# Altium schematic symbol library 13-Logic 数字 IC.SchLib: 324 symbols (part 1 of 30) (continued)
## 5AGXMB1G4F40C4N (continued)
part Q pins: D1 GND (power), D2 GND (power), D5 GND (power), D36 GND (power), D37 GND (power), D38 GND (power), D39 GND (power), E1 GND (power), E2 GND (power), E3 GND (power), E4 GND (power), E8 GND (power), E11 GND (power), E14 GND (power), E17 GND (power), E20 GND (power), E23 GND (power), E26 GND (power), E29 GND (power), E32 GND (power), E35 GND (power), E38 GND (power), E39 GND (power), F1 GND (power), F2 GND (power), F5 GND (power), F36 GND (power), F37 GND (power), F38 GND (power), F39 GND (power), G1 GND (power), G2 GND (power), G3 GND (power), G4 GND (power), G35 GND (power), G38 GND (power), G39 GND (power), H1 GND (power), H2 GND (power), H5 GND (power), H8 GND (power), H11 GND (power), H14 GND (power), H17 GND (power), H20 GND (power), H23 GND (power), H26 GND (power), H29 GND (power), H32 GND (power), H36 GND (power), H37 GND (power), H38 GND (power), H39 GND (power), J1 GND (power), J2 GND (power), J3 GND (power), J4 GND (power), J35 GND (power), J38 GND (power), J39 GND (power), K1 GND (power), K2 GND (power), K5 GND (power), K36 GND (power), K37 GND (power), K38 GND (power), K39 GND (power), L1 GND (power), L2 GND (power), L3 GND (power), L4 GND (power), L8 GND (power), L11 GND (power), L14 GND (power), L17 GND (power), L20 GND (power), L23 GND (power), L26 GND (power), L29 GND (power), L32 GND (power), L35 GND (power), L38 GND (power), L39 GND (power), M1 GND (power), M2 GND (power), M5 GND (power), M36 GND (power), M37 GND (power), M38 GND (power), M39 GND (power), N1 GND (power), N2 GND (power), N3 GND (power), N4 GND (power), N5 GND (power), N6 GND (power), N8 GND (power), N35 GND (power), N38 GND (power), N39 GND (power), P1 GND (power), P2 GND (power), P6 GND (power), P7 GND (power), P11 GND (power), P14 GND (power), P17 GND (power), P20 GND (power), P23 GND (power), P26 GND (power), P29 GND (power), P32 GND (power), P35 GND (power), P36 GND (power), P37 GND (power), P38 GND (power), P39 GND (power), R3 GND (power), R4 GND (power), R8 GND (power), R34 GND (power), R38 GND (power), R39 GND (power), T1 GND (power), T2 GND (power), T5 GND (power), T7 GND (power), T8 GND (power), T9 GND (power), T10 GND (power), T32 GND (power), T36 GND (power), T37 GND (power), T38 GND (power), T39 GND (power), U3 GND (power), U4 GND (power), U6 GND (power), U8 GND (power), U11 GND (power), U13 GND (power), U15 GND (power), U17 GND (power), U20 GND (power), U23 GND (power), U25 GND (power), U27 GND (power), U30 GND (power), U31 GND (power), U32 GND (power), U33 GND (power), U35 GND (power), U38 GND (power), U39 GND (power), V1 GND (power), V2 GND (power), V7 GND (power), V8 GND (power), V9 GND (power), V10 GND (power), V12 GND (power), V14 GND (power), V16 GND (power), V18 GND (power), V21 GND (power), V24 GND (power), V26 GND (power), V28 GND (power), V30 GND (power), V32 GND (power), V34 GND (power), V36 GND (power), V37 GND (power), V38 GND (power), V39 GND (power), W3 GND (power), W4 GND (power), W8 GND (power), W11 GND (power), W13 GND (power), W15 GND (power), W17 GND (power), W19 GND (power), W21 GND (power), W23 GND (power), W25 GND (power), W27 GND (power), W29 GND (power), W31 GND (power), W32 GND (power), W33 GND (power), W38 GND (power), W39 GND (power), Y1 GND (power), Y2 GND (power), Y5 GND (power), Y7 GND (power), Y10 GND (power), Y12 GND (power), Y14 GND (power), Y16 GND (power), Y18 GND (power), Y20 GND (power), Y22 GND (power), Y24 GND (power), Y26 GND (power), Y28 GND (power), Y31 GND (power), Y32 GND (power), Y36 GND (power), Y37 GND (power), Y38 GND (power), Y39 GND (power)
part R pins: A38 DNU (io), AE20 DNU (io), AF3 DNU (io), AF4 DNU (io), AH3 DNU (io), AH4 DNU (io), AH31 DNU (io), AK3 DNU (io), AK4 DNU (io), AV3 DNU (io), AW3 DNU (io), B3 DNU (io), B4 DNU (io), B38 DNU (io), C5 DNU (io), C36 DNU (io), C37 DNU (io), D3 DNU (io), D4 DNU (io), E36 DNU (io), E37 DNU (io), F3 DNU (io), F4 DNU (io), G36 DNU (io), G37 DNU (io), H3 DNU (io), H4 DNU (io), J36 DNU (io), J37 DNU (io), K3 DNU (io), K4 DNU (io), L36 DNU (io), L37 DNU (io), M3 DNU (io), M4 DNU (io), N36 DNU (io), N37 DNU (io), P21 DNU (io), R36 DNU (io), R37 DNU (io), U36 DNU (io), U37 DNU (io), W36 DNU (io), W37 DNU (io)

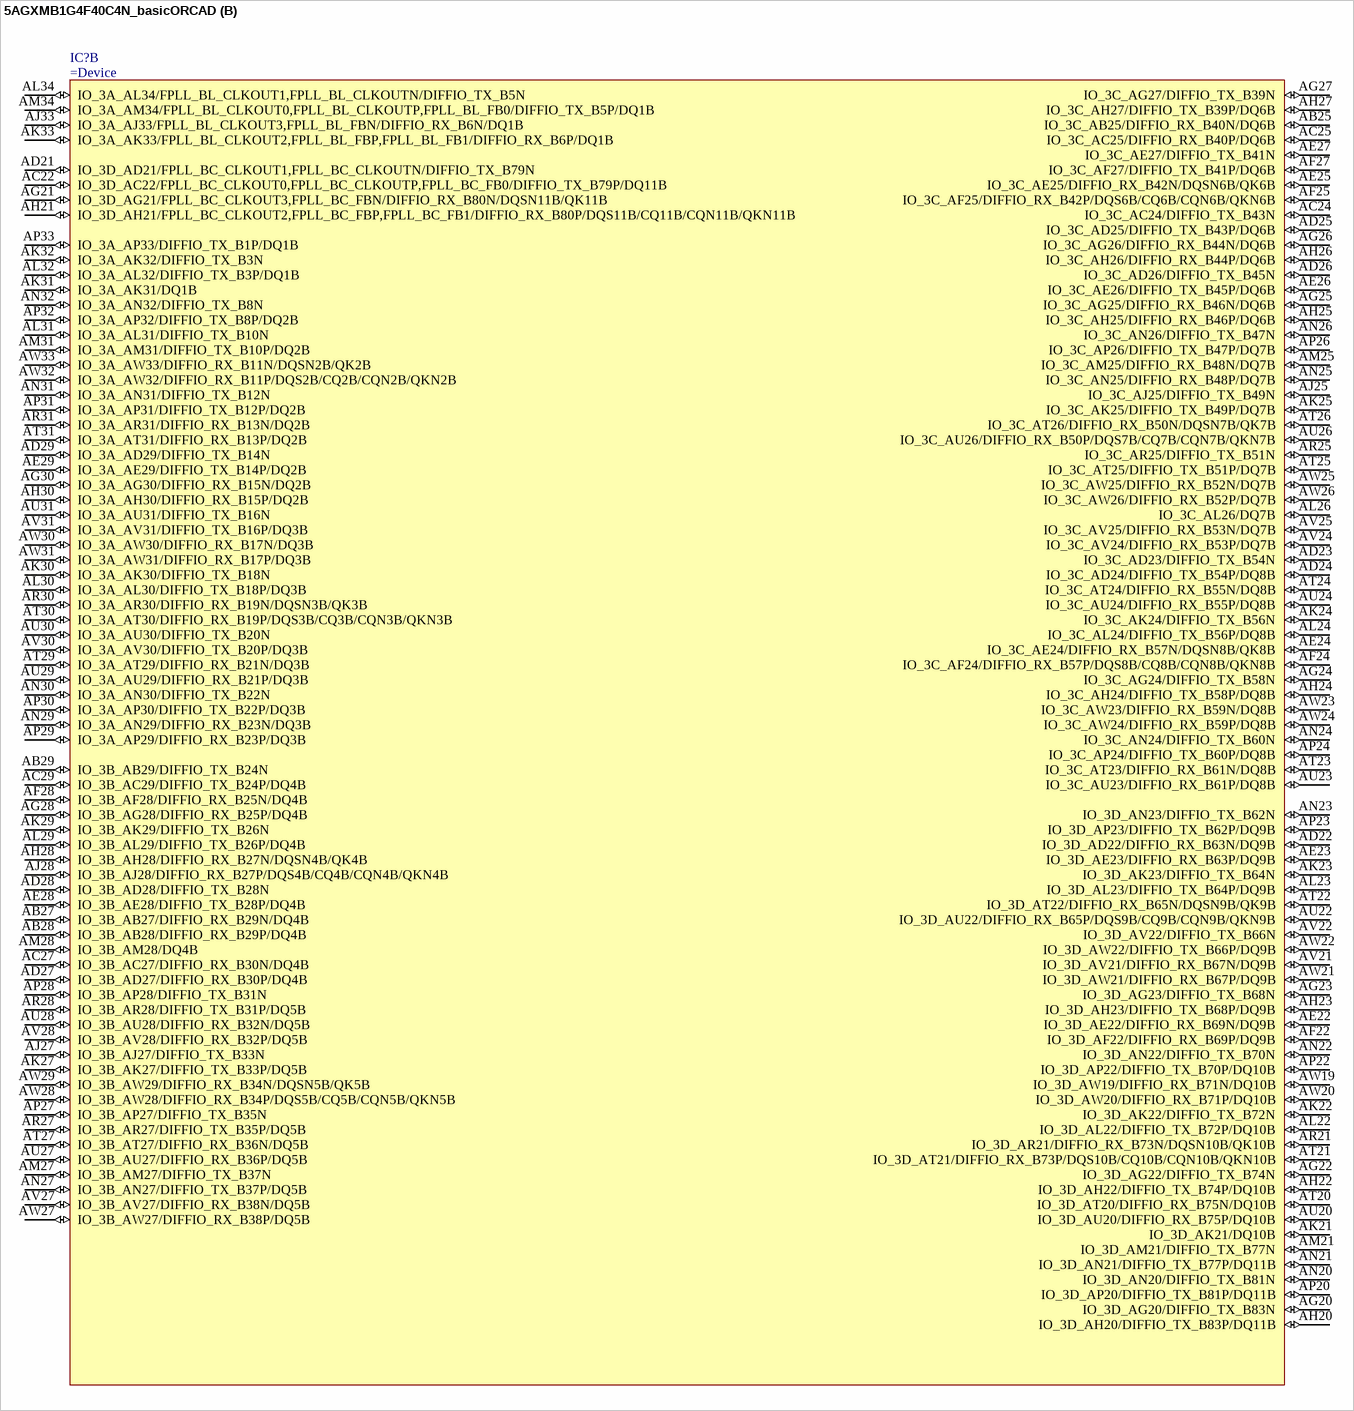
[diagram p6: symbol 5AGXMB1G4F40C4N_basicORCAD]

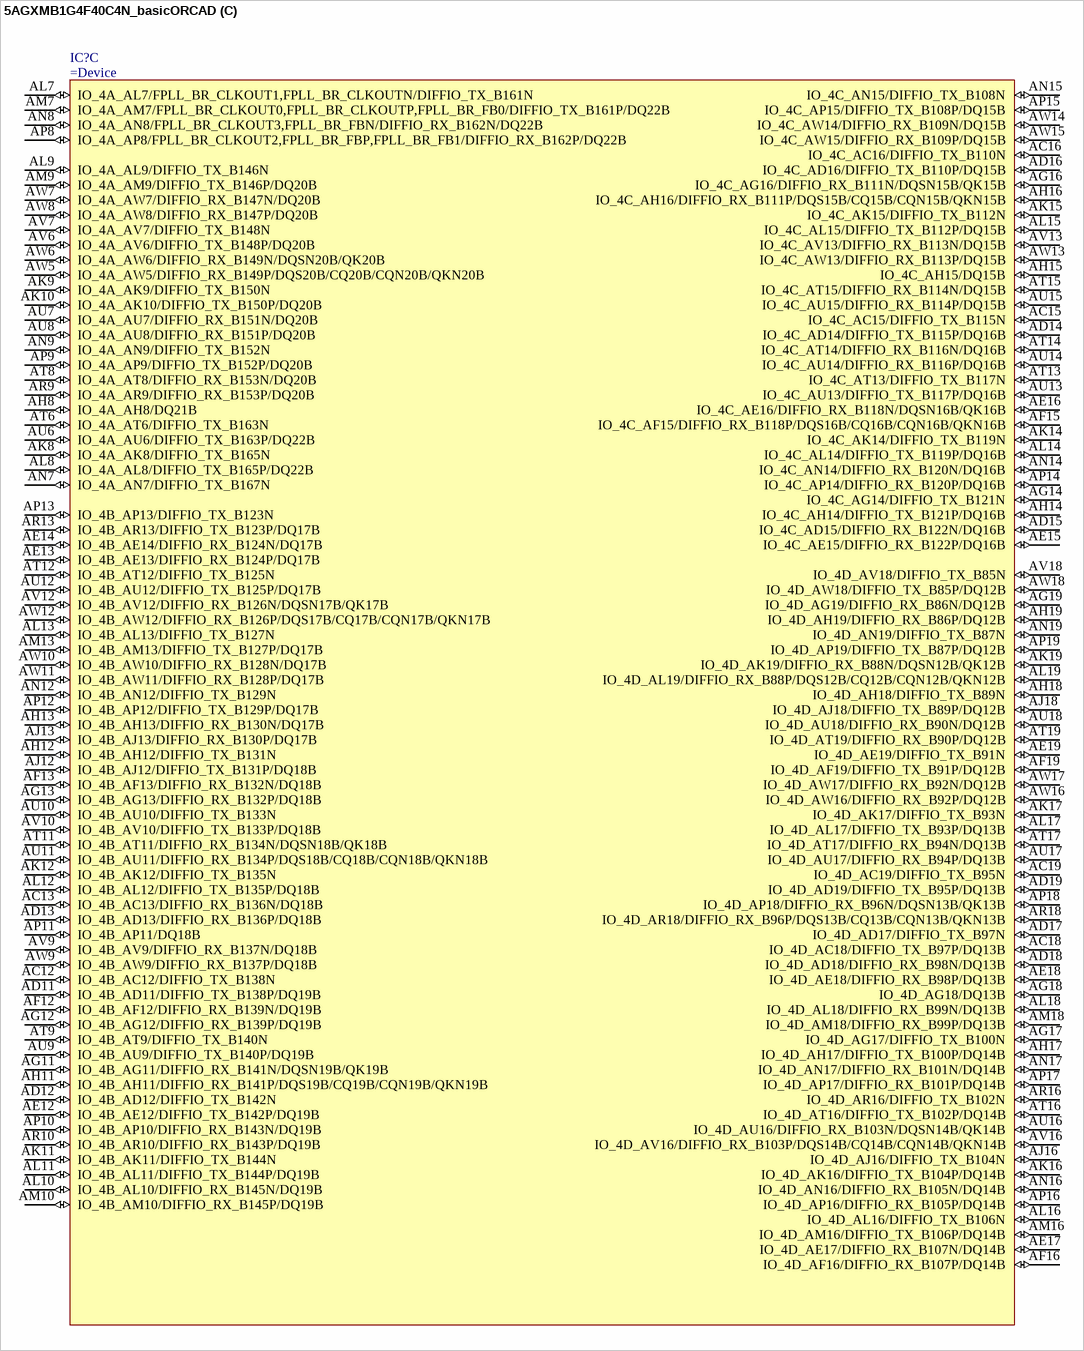
[diagram p7: symbol 5AGXMB1G4F40C4N_basicORCAD]

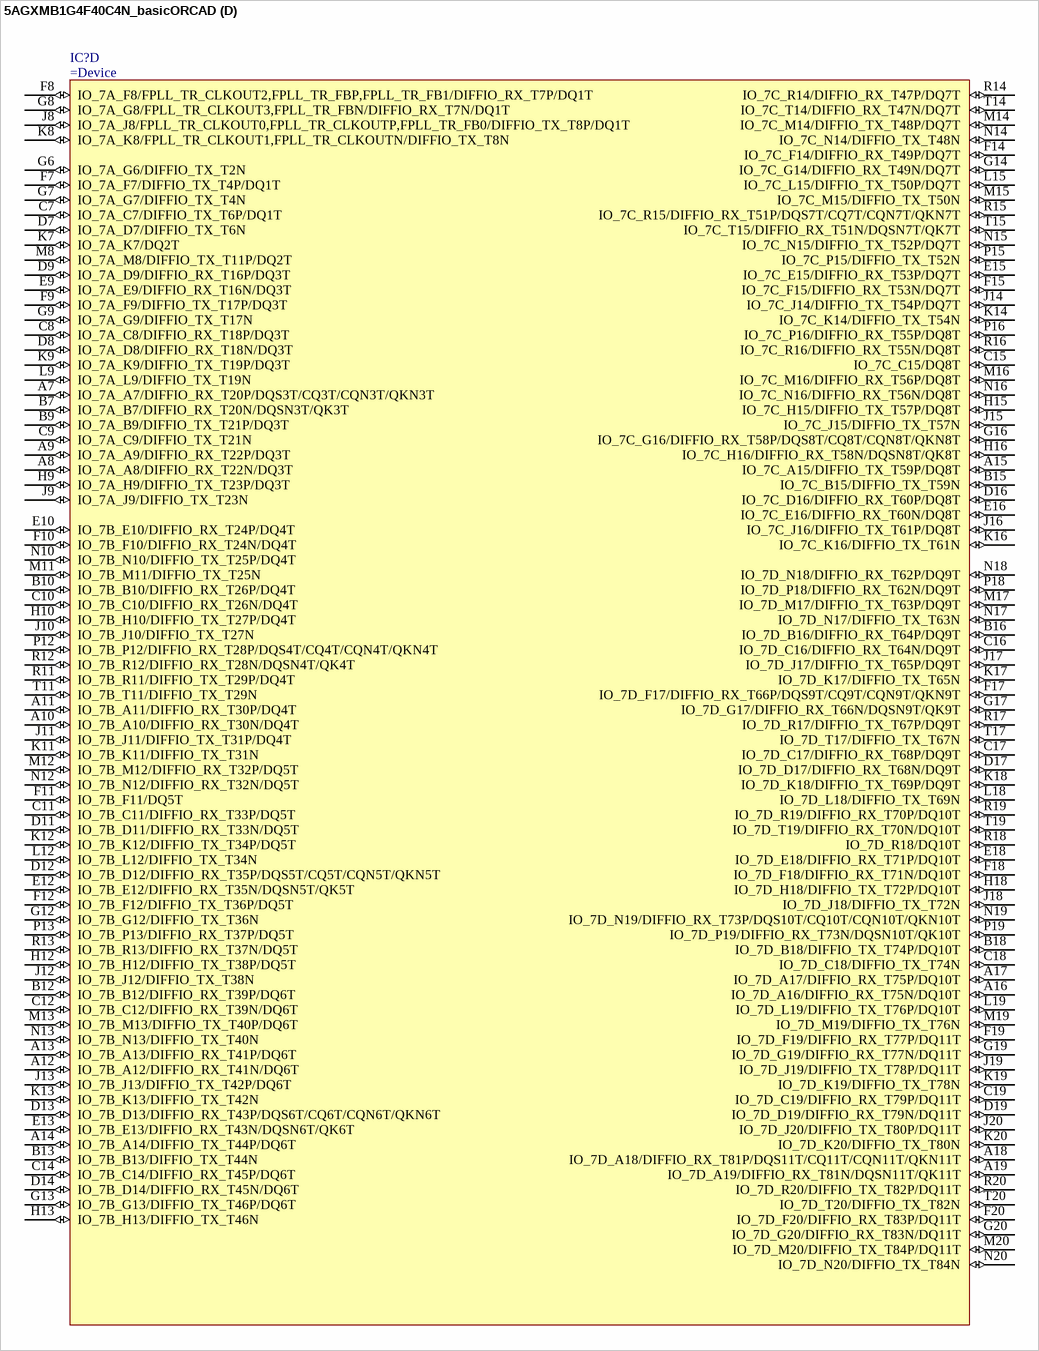
[diagram p8: symbol 5AGXMB1G4F40C4N_basicORCAD]

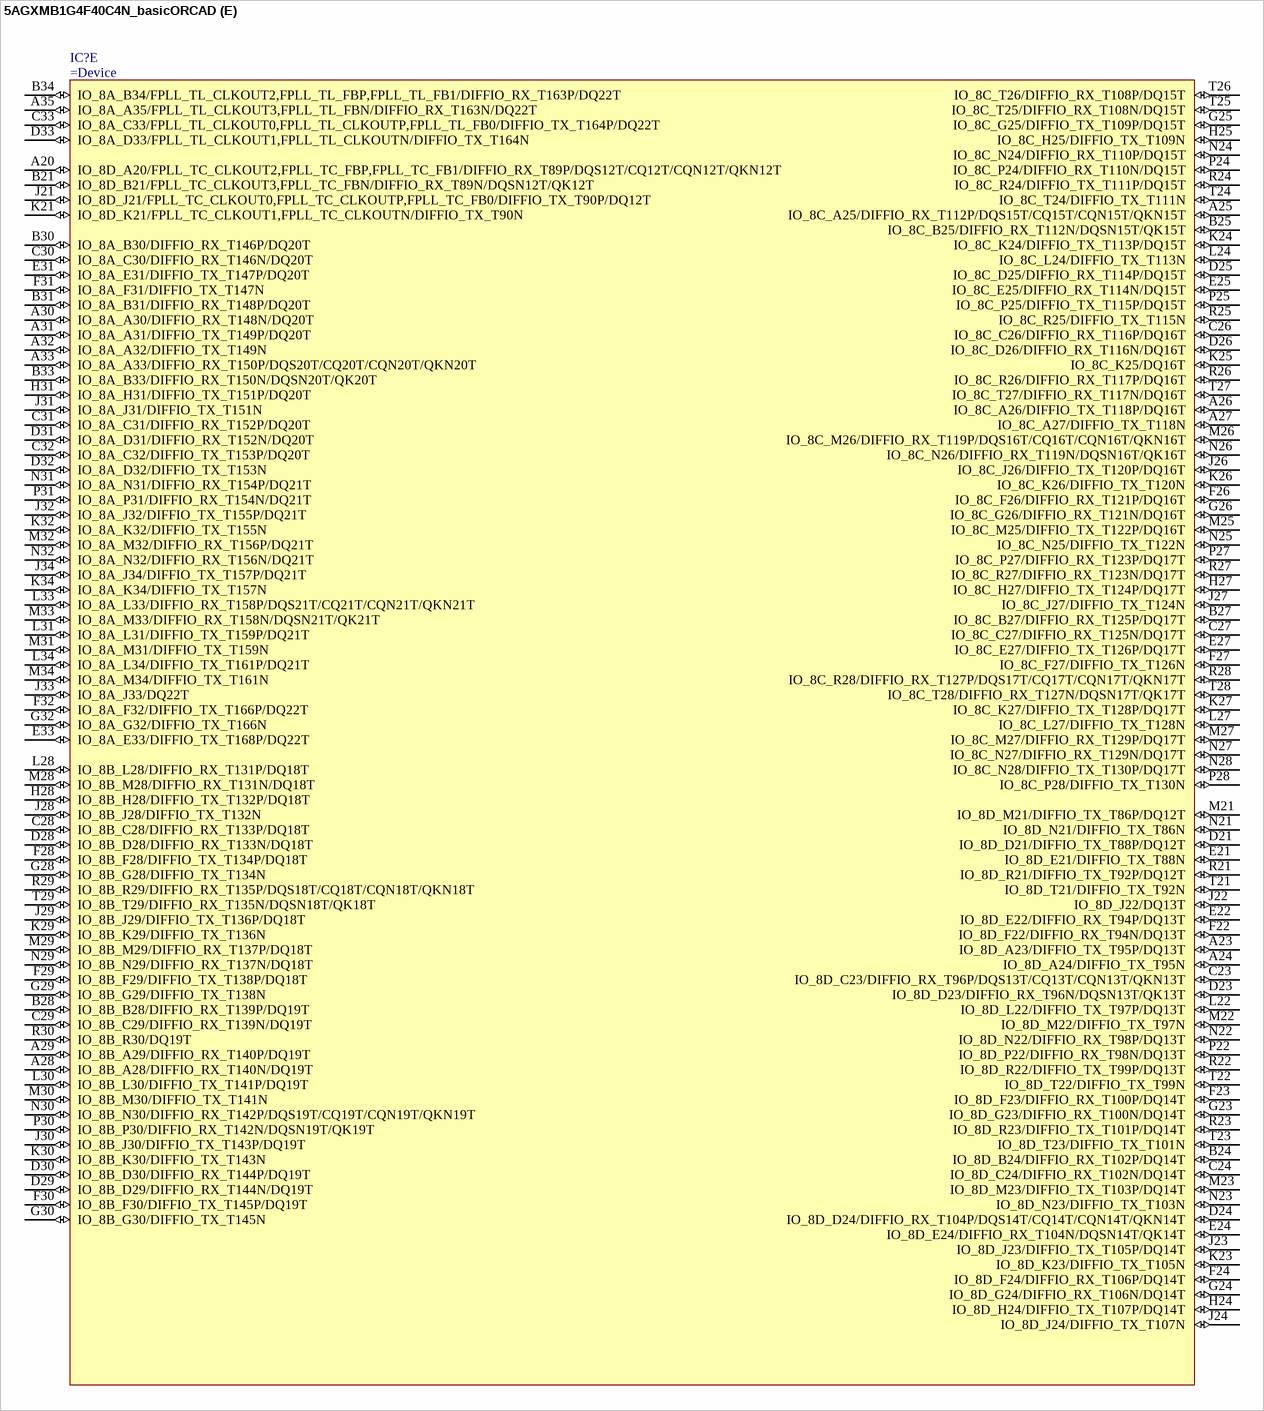
[diagram p9: symbol 5AGXMB1G4F40C4N_basicORCAD]

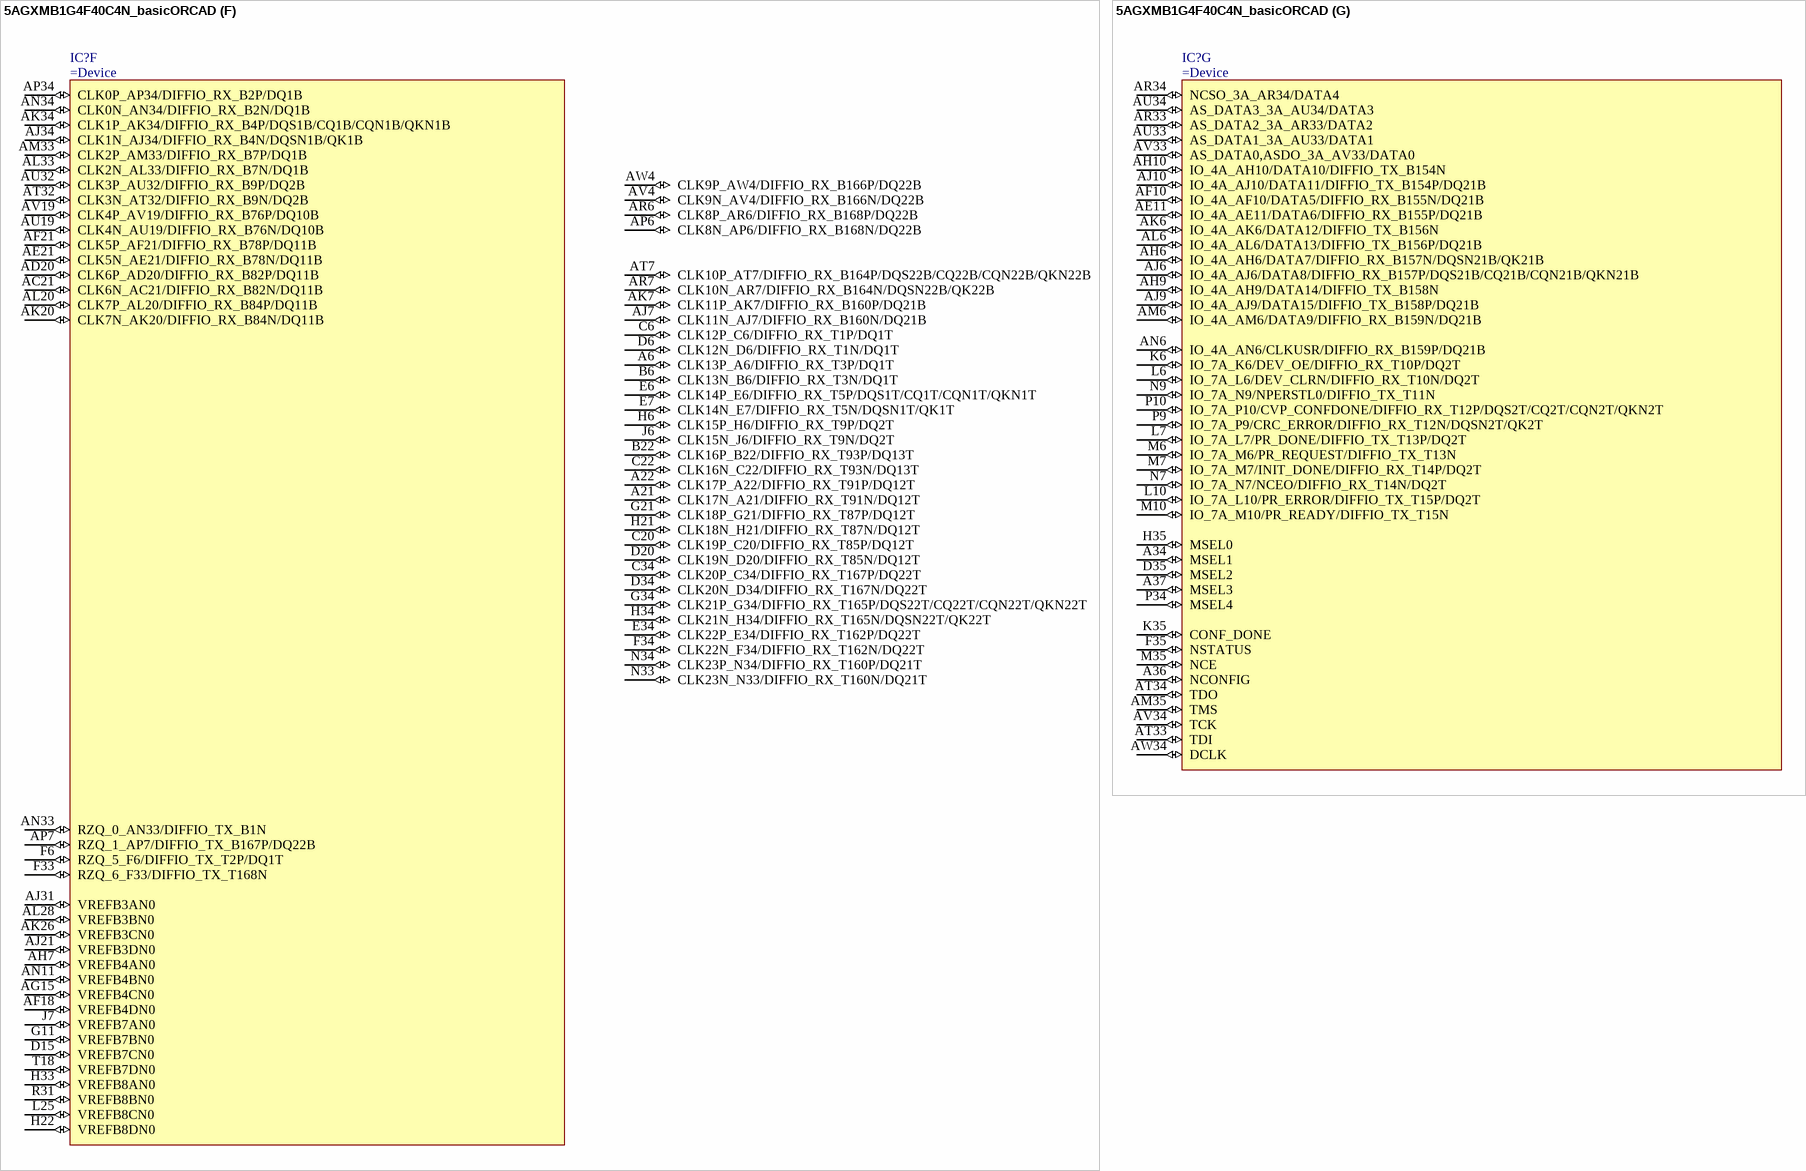
[diagram p10: symbol 5AGXMB1G4F40C4N_basicORCAD]

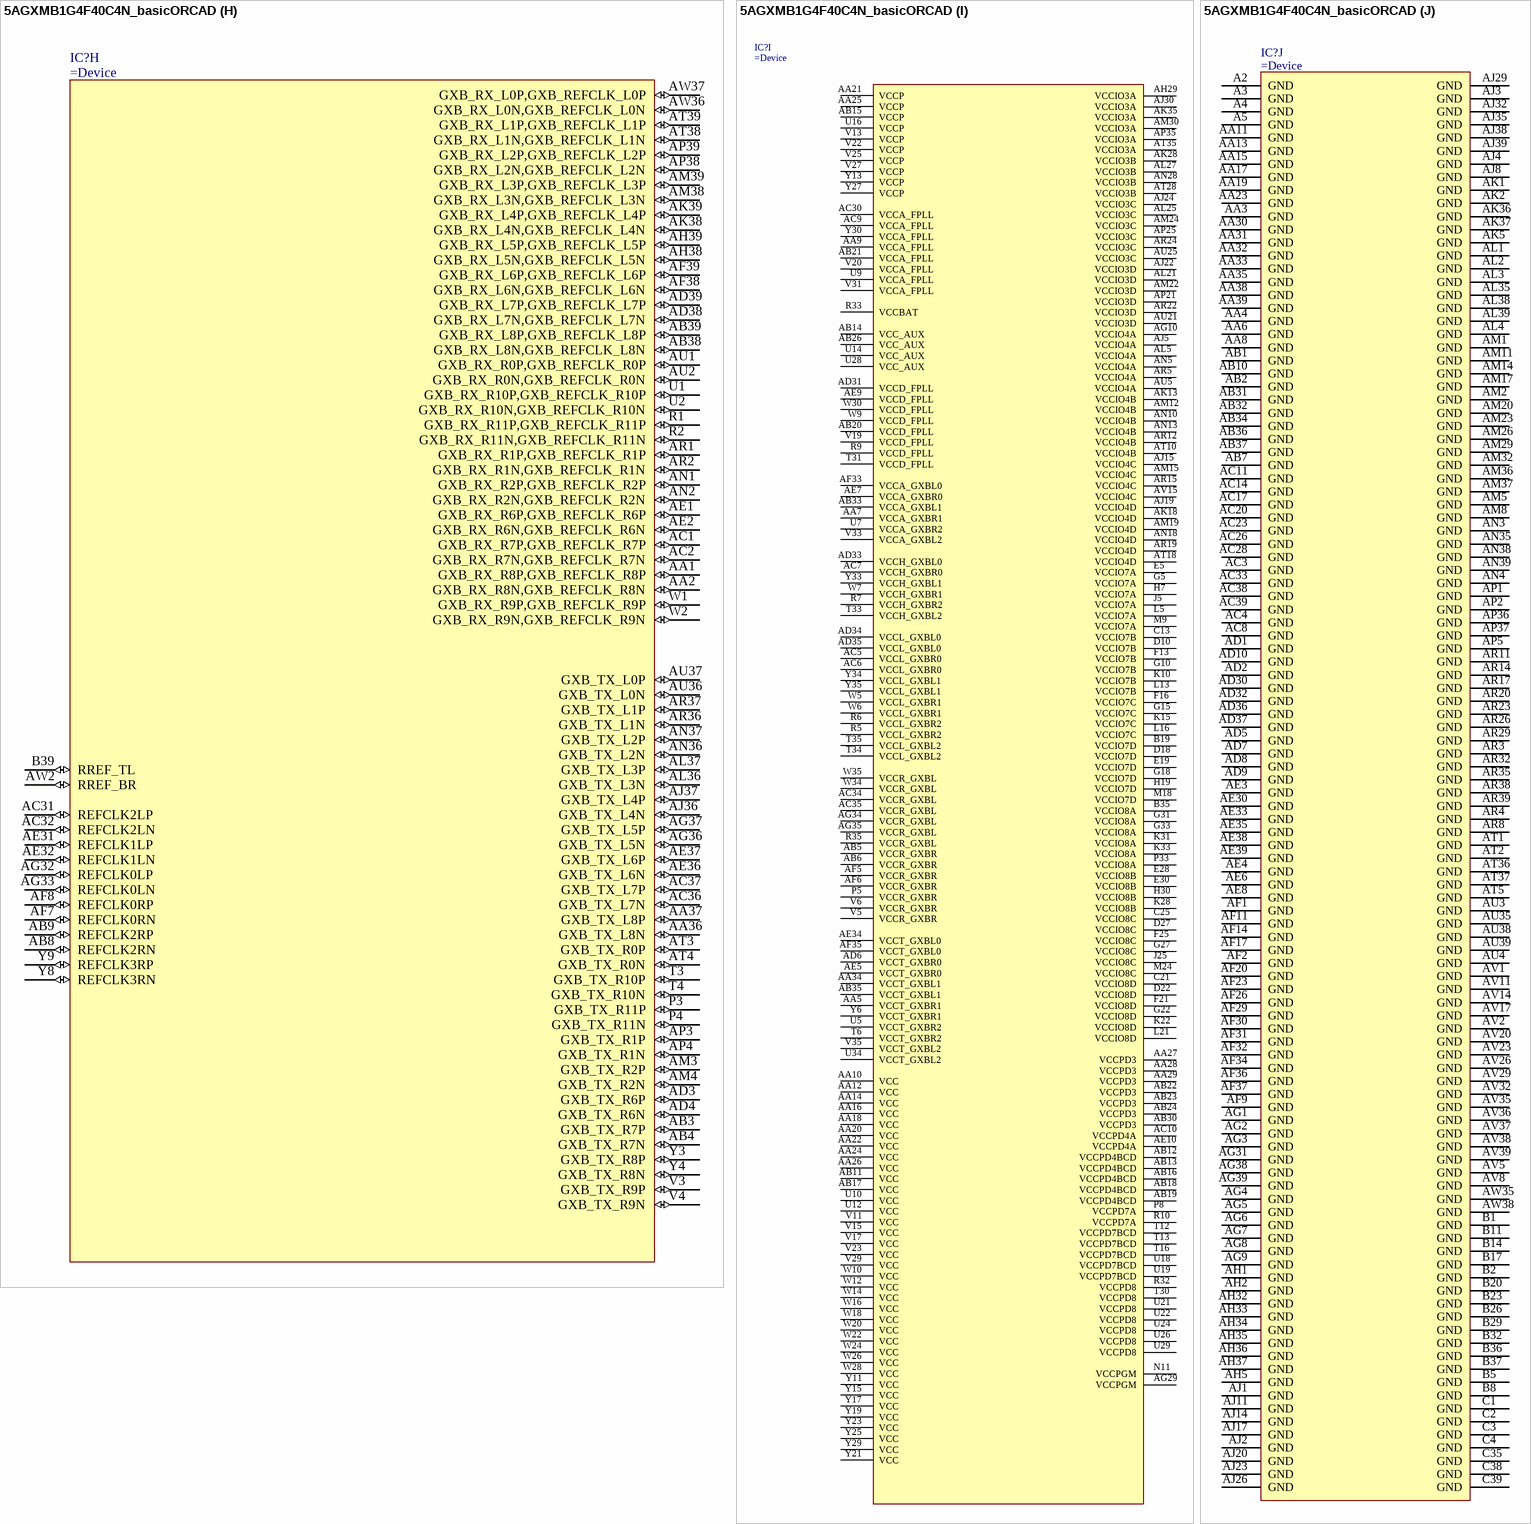
[diagram p11: symbol 5AGXMB1G4F40C4N_basicORCAD]

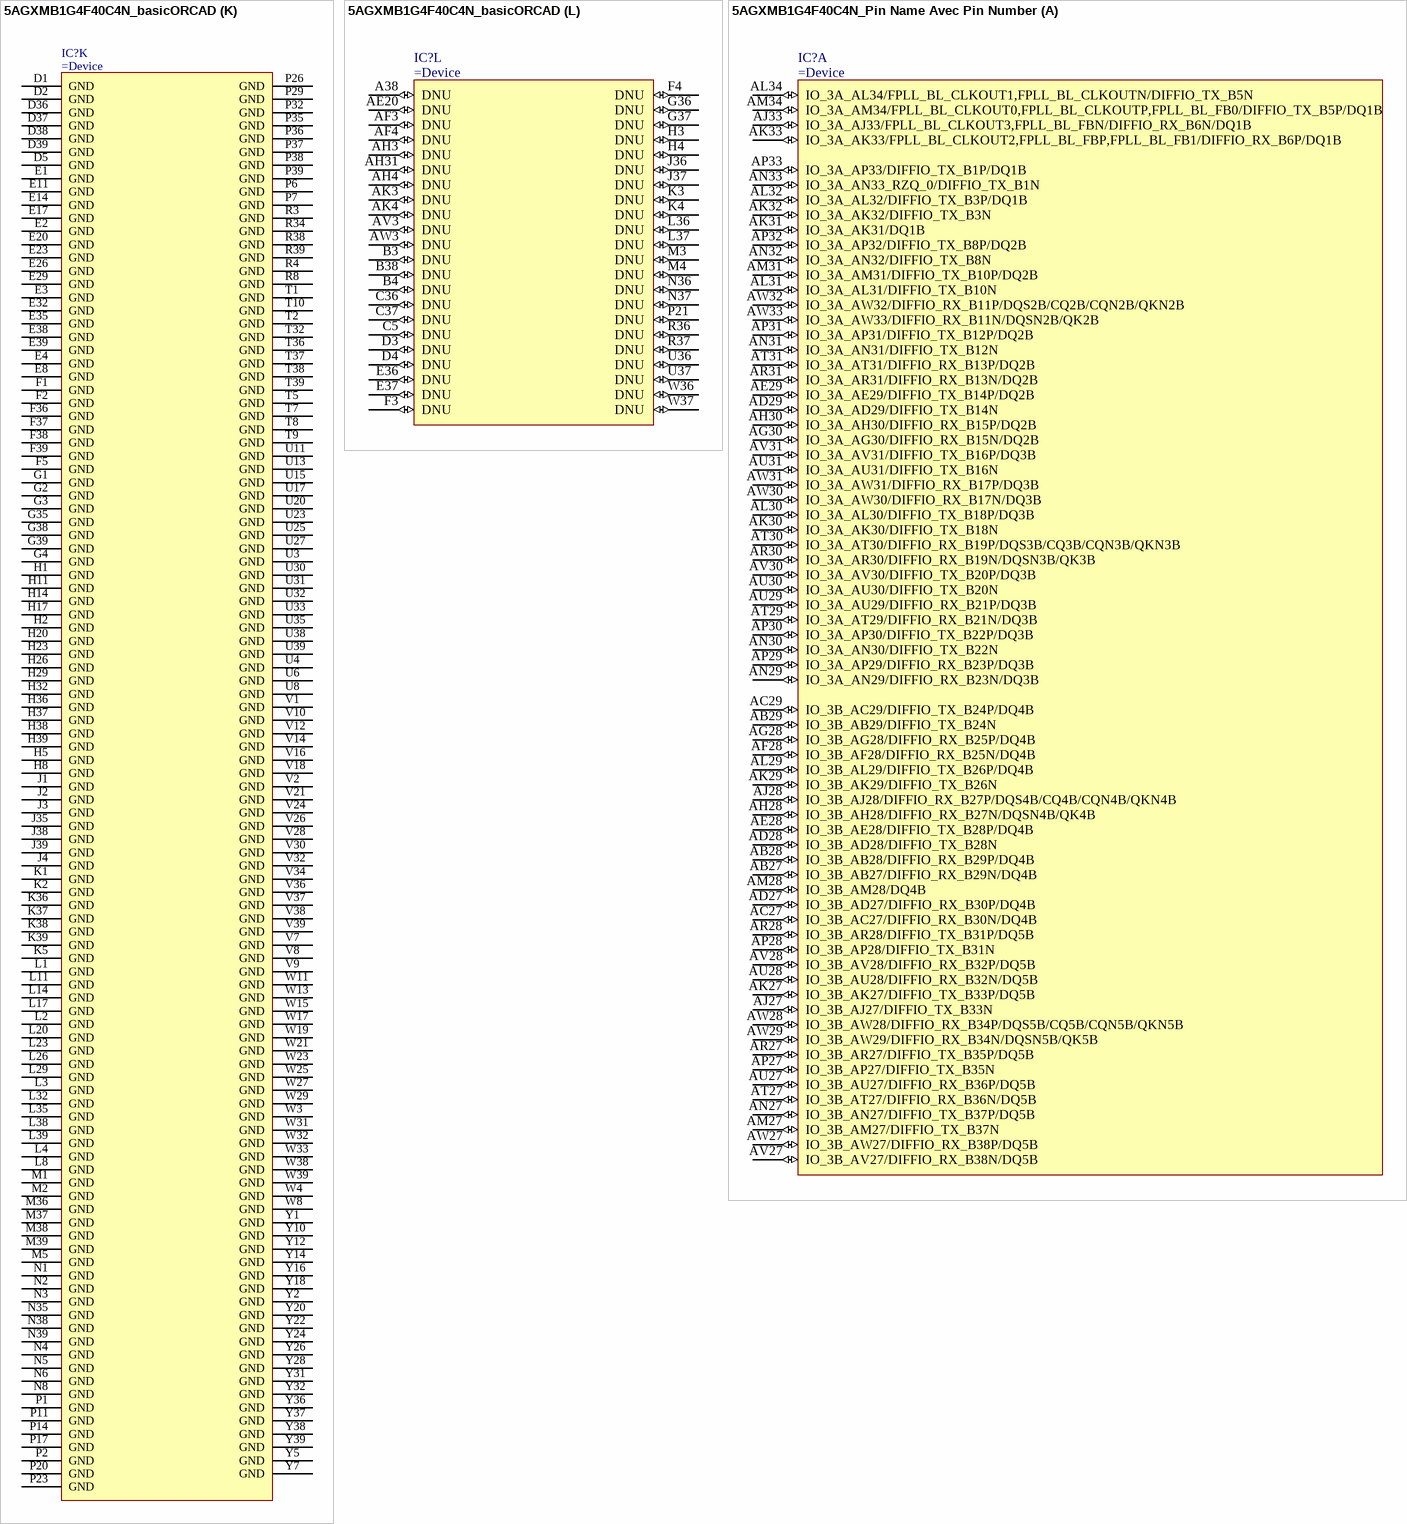
[diagram p12: symbols 5AGXMB1G4F40C4N_basicORCAD to 5AGXMB1G4F40C4N_Pin Name Avec Pin Number]